# Altium schematic symbol library BARKO_SCHLIB.SchLib: 1064 symbols (part 2 of 11) (continued)
## CON-8POS-2.5MM-VERT (continued)
CONN HEADER 8POS 2.5MM VERT TIN; Manufacturer: Molex Waldom; Gender: Male; Number of Contacts: 8; Insulation Resistance: 1GR; Current Rating: 3A; Voltage Rating (DC): 250V; Glow Wire Compliant: Non-compliant; .PCBCHK: USED; .Creator: F:TALI; Washability: OK; Supplier 1: Digi-Key; Manufacturer Part Number: 22-03-5085; Stock 1: 10422; Pricing 1: 1=1.19, 10=1.046, 100=0.902, 500=0.738, 1000=0.656, 5000=0.574, 10000=0.5453 (USD); Number of Pins: 8; Contact Plating: Tin; Contact Material: Brass; Housing Material: Nylon; Orientation: Vertical; Packaging: Bag; Number of Rows: 1; Number of Positions: 8; Number of Circuits: 8; Length: 22.4mm; Height: 5.9mm; Width: 4.9mm; Lead Free: Lead Free; Flammability Rating: UL94 V-0; ComponentLink1URL: http://www.onlinecomponents.com/productFiles/mf-MOL/0022035085_pcb_headers.pdf; ComponentLink1Description: http://www.onlinecomponents.com/productFiles/mf-MOL/0022035085_pcb_headers.pdf; Supplier Part Number 1: WM18892-ND; .SCHCHK: USED
pins: 1 GND_IN, 2, 3, 4, 5, 6, 7, 8

## CON-8POS-2.54MM-SMD
designator J?, comment 2.54MM
TERM BLK 8P SIDE ENT 2.54MM SMD; Manufacturer: HARTING Technology; Manufacturer Part Number: 14010813102000; Gender: Receptacle; Voltage Rating: 160V; Number of Levels: 1; Number of Positions Per Level: 8; Current: 6A; Current Rating: 8.4A; Pitch: 0.1inch; Wire Gauge (Max): 26AWG; Wire Gauge (Min): 20AWG; Supplier 1: Digi-Key; Supplier Part Number 1: 1195-3662-1-ND; Stock: 484; Pricing: 1=2.11, 10=1.913, 100=1.6401 (USD); RoHS: Yes; Mount: Surface Mount,Panel; Contact Plating: Tin; Contact Material: Copper; Color: Black; Material: Polymer,Glass fibre; Housing Material: Liquid Crystal Polymer; Min Operating Temperature: -40°C; Max Operating Temperature: 125°C; Packaging: Tape and Reel; Voltage: 160V; Termination: Screwless; Number of Contacts: 8; Number of Rows: 2; Orientation: Horizontal; Length: 25.01mm; Width: 9.2mm; Depth: 5mm; REACH SVHC: No SVHC; ComponentLink1URL: https://datasheet.ciiva.com/48506/harting-1401xx13102000-eng-tds01-48506086.pdf?src-supplier=Distrelec; ComponentLink1Description: https://datasheet.ciiva.com/48506/harting-1401xx13102000-eng-tds01-48506086.pdf?src-supplier=Distrelec; ComponentLink2URL: https://datasheet.ciiva.com/46428/1817031-46428390.pdf?src-supplier=Element14; ComponentLink2Description: https://datasheet.ciiva.com/46428/1817031-46428390.pdf?src-supplier=Element14; ComponentLink3URL: https://datasheet.ciiva.com/49025/70357504-49025163.pdf?src-supplier=Allied+Electronics; ComponentLink3Description: https://datasheet.ciiva.com/49025/70357504-49025163.pdf?src-supplier=Allied+Electronics
footprint CON-HARTING-8POS-2.54MM
pins: 1 GND_IN, 2, 3, 4, 5, 6, 7, 8, MP1, MP2

## CON-8POS-691402910008B
designator J?, comment 2.54MM
2.54 MM TERMINAL BLOCK, HORIZONT; Manufacturer: Wurth Electronics; Manufacturer Part Number: 691402910008B; Supplier 1: Digi-Key; Supplier Part Number 1: 732-691402910008B-ND; Stock: 178; Pricing: 1=3.88, 10=3.623, 50=3.465, 100=3.256, 420=2.838 (USD); RoHS: No
footprint CON-8POS-691402910008B (2.54 mm - Screwless Horizontal Entry - 08p)
pins: 1, 2, 3, 4, 5, 6, 7, 8

## CON-10POS 2MM
designator J?, comment 2MM
CONN HEADER SMD 10POS 2MM; Manufacturer: METZ CONNECT; Manufacturer Part Number: PM20C05VBDN; .Creator: M.OZKAN; .PCBCHK: USED; ComponentLink1URL: http://portal.fciconnect.com/Comergent/fci/drawing/20021121.pdf?src-supplier=Avnet; ComponentLink1Description: http://portal.fciconnect.com/Comergent/fci/drawing/20021121.pdf?src-supplier=Avnet; ComponentLink2URL: http://portal.fciconnect.com/Comergent//fci/drawing/20021121.pdf?src-supplier=Digi-Key; ComponentLink2Description: http://portal.fciconnect.com/Comergent//fci/drawing/20021121.pdf?src-supplier=Digi-Key; ComponentLink3URL: https://datasheet.ciiva.com/720/57202-720124.pdf?src-supplier=Digi-Key; ComponentLink3Description: https://datasheet.ciiva.com/720/57202-720124.pdf?src-supplier=Digi-Key; ComponentLink4URL: https://datasheet.ciiva.com/9473/57202-9473821.pdf?src-supplier=Avnet; ComponentLink4Description: https://datasheet.ciiva.com/9473/57202-9473821.pdf?src-supplier=Avnet; ComponentLink5URL: https://datasheet.ciiva.com/8050/57202-8050203.pdf?src-supplier=Element14; ComponentLink5Description: https://datasheet.ciiva.com/8050/57202-8050203.pdf?src-supplier=Element14; ComponentLink6URL: https://datasheet.ciiva.com/5155/57202-5155726.pdf?src-supplier=Mouser; ComponentLink6Description: https://datasheet.ciiva.com/5155/57202-5155726.pdf?src-supplier=Mouser; .SCHCHK: USED; Supplier 1: Digi-Key; Supplier Part Number 1: 1849-1015-ND; Stock: 5119; Pricing: 1=0.61, 10=0.568, 100=0.4351, 500=0.3784, 1000=0.3122, 5000=0.2743, 10000=0.2554 (USD); RoHS: No
footprint CON-10POS 2MM SMD
pins: 1 (in), 2 (in), 3 (in), 4 (in), 5 (in), 6 (in), 7 (in), 8 (in), 9 (in), 10 (in)

## CON-10POS-2MM-14.50mm
designator J?, comment 2MM
CONN HEADER VERT 10POS 2MM; Manufacturer: Samtec; Manufacturer Part Number: MTMM-105-14-L-D-571; Supplier 1: Digi-Key; Supplier Part Number 1: MTMM-105-14-L-D-571-ND; Stock: 823; Pricing: 1=1.81, 10=1.642, 100=1.407, 500=1.1725, 1000=1.005, 5000=0.8911, 10000=0.871 (USD); RoHS: No; Contact Material: Bronze; Number of Rows: 2; Lead Free: Lead Free; ComponentLink1Description: datasheet; ComponentLink1URL: http://suddendocs.samtec.com/prints/mtmm-1xx-xx-xx-x-xxx-xx-xxx-mkt.pdf
footprint CON-10POS-2mm-14.5mm
pins: 1, 2, 3, 4, 5, 6, 7, 8, 9, 10

## CON-10POS-2MM-SMD
designator J?, comment 2MM
CONN RCPT 10POS 0.079 GOLD SMD; Manufacturer: TE Connectivity AMP; Manufacturer Part Number: 1-2314844-0; Supplier 1: Digi-Key; Supplier Part Number 1: 17-1-2314844-0-ND; Stock: 1348; Pricing: 1=0.78, 10=0.681 (USD); RoHS: No; ComponentLink1Description: datasheet; ComponentLink1URL: https://www.te.com/usa-en/product-1-2314844-0.datasheet.pdf
footprint CON-10POS 2MM RCPT
pins: 1, 2, 3, 4, 5, 6, 7, 8, 9, 10

## CON-12POS-1.27MM
designator J?, comment 1.27MM - MALE
CONN HEADER SMD 12POS 1.27MM; Manufacturer: Samtec; Manufacturer Part Number: FTSH-106-01-F-DV-P-TR; Number of Contacts: 12; Washability: OK; .Creator: M.OZKAN; .PCBCHK: USED; Supplier 1: Digi-Key; Stock 1: 614; Pricing 1: 1=2.67000, 10=2.42600, 100=2.07900 (USD); RoHS: Yes; Contact Plating: Gold; Contact Material: Bronze; Housing Color: Black; Housing Material: Polymer; Min Operating Temperature: -55°C; Max Operating Temperature: 125°C; Number of Rows: 2; Termination: Solder; Packaging: Tape and Reel; Gender: Male; Orientation: Straight; Length: 7.62mm; Pitch: 1.27mm; Depth: 3.43mm; Radiation Hardening: No; Lead Free: Lead Free; ComponentLink1URL: https://datasheet.ciiva.com/16689/ftsh-mt-16689389.pdf?src-supplier=Avnet+Europe; ComponentLink1Description: https://datasheet.ciiva.com/16689/ftsh-mt-16689389.pdf?src-supplier=Avnet+Europe; Supplier Part Number 1: SAM13943CT-ND; .SCHCHK: USED
footprint CON-2X6-1.27MM (CONN HEADER SMD 12POS 1.27MM)
pins: 1, 2, 3, 4, 5, 6, 7, 8, 9, 10, 11, 12

## CON-12POS-1.27MM-FEMALE-SMD
designator J?, comment 1.27MM
CONN RCPT 12POS 0.05 GOLD SMD; Manufacturer 1: Samtec; Manufacturer Part Number 1: FLE-106-01-G-DV-K-TR; Contact Resistance: 15mR; Gender: Receptacle; Number of Contacts: 12; Washability: OK; .Creator: M.OZKAN; .PCBCHK: USED; Supplier 1: Digi-Key; Stock 1: 737; Pricing 1: 1=2,55000, 10=2,45000 (USD); RoHS: Yes; Contact Plating: Gold; Contact Material: Bronze; Housing Color: Black; Housing Material: Polymer; Min Operating Temperature: -55°C; Max Operating Temperature: 125°C; Number of Rows: 2; Packaging: Tape and Reel; Termination: Solder; Orientation: Straight; Length: 7.73mm; Pitch: 1.27mm; Depth: 3.33mm; Radiation Hardening: No; REACH SVHC: No SVHC; ComponentLink1URL: http://components.arrow.com/part/dataview/0323_01323830?src-supplier=Arrow+Europe; ComponentLink1Description: http://components.arrow.com/part/dataview/0323_01323830?src-supplier=Arrow+Europe; ComponentLink2URL: http://www.farnell.com/datasheets/1927685.pdf?src-supplier=Farnell; ComponentLink2Description: http://www.farnell.com/datasheets/1927685.pdf?src-supplier=Farnell; ComponentLink3URL: http://www.samtec.com/documents/webfiles/pdf/FLE_SM.PDF?src-supplier=Avnet; ComponentLink3Description: http://www.samtec.com/documents/webfiles/pdf/FLE_SM.PDF?src-supplier=Avnet; Supplier Part Number 1: SAM13855CT-ND; .SCHCHK: USED
footprint CON-12POS FEMALE 2MM SMD
pins: 1, 2, 3, 4, 5, 6, 7, 8, 9, 10, 11, 12

## CON-12POS-1.27MM-MALE-SMD
designator J?, comment 1.27MM
CONN HEADER SMD 12POS 1.27MM; Manufacturer 1: Samtec; Manufacturer Part Number 1: FTSH-106-02-L-DV-P-TR; Number of Contacts: 12; Gender: Male; Washability: OK; .Creator: M.OZKAN; .PCBCHK: USED; Supplier 1: Avnet; Stock 1: 0; Pricing 1: 125=2,19000, 250=1,99000, 500=1,89000, 750=1,79000, 1250=1,69000 (USD); RoHS: Yes; Mount: Surface Mount; Contact Plating: Gold; Contact Material: Bronze; Number of Rows: 2; Packaging: Tape and Reel; Termination: SMD/SMT; Pitch: 1.27mm; Radiation Hardening: No; REACH SVHC: No SVHC; Lead Free: Lead Free; ComponentLink1URL: https://datasheet.ciiva.com/10306/ftsh-mt-10306247.pdf?src-supplier=Avnet; ComponentLink1Description: https://datasheet.ciiva.com/10306/ftsh-mt-10306247.pdf?src-supplier=Avnet; ComponentLink2URL: https://datasheet.ciiva.com/41677/1801432-41677018.pdf?src-supplier=Newark; ComponentLink2Description: https://datasheet.ciiva.com/41677/1801432-41677018.pdf?src-supplier=Newark; Supplier Part Number 1: FTSH-106-02-L-DV-P-TR; .SCHCHK: USED
footprint CON-12POS MALE 2MM SMD
pins: 1, 2, 3, 4, 5, 6, 7, 8, 9, 10, 11, 12

## CON-12POS-1.27MM-RCP
designator J?, comment 1.27MM-FEMALE
CONN RCPT 12POS 0.05 GOLD SMD; Manufacturer: Samtec; Manufacturer Part Number: FLE-106-01-G-DV-K-TR; Contact Resistance: 15mR; Gender: Receptacle; Number of Contacts: 12; Pitch: 1.27mm; Washability: OK; .Creator: M.OZKAN; .PCBCHK: USED; Supplier 1: Digi-Key; Stock 1: 737; Pricing 1: 1=2.55000, 10=2.45000 (USD); RoHS: Yes; Contact Plating: Gold; Contact Material: Bronze; Housing Color: Black; Housing Material: Polymer; Min Operating Temperature: -55°C; Max Operating Temperature: 125°C; Number of Rows: 2; Packaging: Tape and Reel; Termination: Solder; Orientation: Straight; Length: 7.73mm; Depth: 3.33mm; Radiation Hardening: No; REACH SVHC: No SVHC; ComponentLink1URL: http://components.arrow.com/part/dataview/0323_01323830?src-supplier=Arrow+Europe; ComponentLink1Description: http://components.arrow.com/part/dataview/0323_01323830?src-supplier=Arrow+Europe; ComponentLink2URL: http://www.farnell.com/datasheets/1927685.pdf?src-supplier=Farnell; ComponentLink2Description: http://www.farnell.com/datasheets/1927685.pdf?src-supplier=Farnell; ComponentLink3URL: http://www.samtec.com/documents/webfiles/pdf/FLE_SM.PDF?src-supplier=Avnet; ComponentLink3Description: http://www.samtec.com/documents/webfiles/pdf/FLE_SM.PDF?src-supplier=Avnet; Supplier Part Number 1: SAM13855CT-ND; .SCHCHK: USED
footprint CON-2X6-1.27MM-RCPT (CONN RCPT 12POS 0.05 GOLD SMD)
pins: 1, 2, 3, 4, 5, 6, 7, 8, 9, 10, 11, 12

## CON-12POS-1MM
designator J?, comment 1MM  Mating: 5013301200
CONN HEADER SMD 12POS 1MM; Manufacturer: Molex; Manufacturer Part Number: 501331-1207; Current Rating: 1A; Voltage Rating: 50V; Number of Positions: 12; Gender: Male; Connector Type: Male Pin; Contact Resistance: 20mR; Glow Wire Compliant: Non-compliant; Washability: OK; .Creator: M.OZKAN; .PCBCHK: USED; Supplier 1: Digi-Key; Supplier Part Number 1: WM7889CT-ND; Stock 1: 5532; Pricing 1: 1=0.96000, 10=0.84500, 100=0.72870, 500=0.59618 (USD); RoHS: Yes; Mount: Surface Mount; Contact Material: Bronze,Tin; Color: Natural; Housing Color: Natural; Housing Material: Nylon; Contact Plating: Tin; Min Operating Temperature: -40°C; Max Operating Temperature: 85°C; Number of Rows: 1; Package Quantity: 1100; Packaging: Tape and Reel; Termination: Solder; Fastening Type: Detent; Number of Contacts: 12; Orientation: Vertical; Max Voltage Rating (DC): 50V; Max Voltage Rating (AC): 50V; Voltage Rating (DC): 50V; Number of Circuits: 12; Length: 14.24mm; Pitch: 1mm; Depth: 5.07mm; Radiation Hardening: No; REACH SVHC: Unknown; Lead Free: Lead Free; ComponentLink1URL: https://datasheet.ciiva.com/724/5013311107-sd-724400.pdf?src-supplier=Digi-Key; ComponentLink1Description: https://datasheet.ciiva.com/724/5013311107-sd-724400.pdf?src-supplier=Digi-Key; ComponentLink2URL: https://datasheet.ciiva.com/23725/650551-23725122.pdf?src-supplier=Newark; ComponentLink2Description: https://datasheet.ciiva.com/23725/650551-23725122.pdf?src-supplier=Newark; ComponentLink3URL: https://datasheet.ciiva.com/5153/5013311207-pcb-headers-179229-5153793.pdf?src-supplier=Mouser; ComponentLink3Description: https://datasheet.ciiva.com/5153/5013311207-pcb-headers-179229-5153793.pdf?src-supplier=Mouser; ComponentLink4URL: https://datasheet.ciiva.com/9469/5013311207-pcb-headers-9469090.pdf?src-supplier=Avnet; ComponentLink4Description: https://datasheet.ciiva.com/9469/5013311207-pcb-headers-9469090.pdf?src-supplier=Avnet; ComponentLink5URL: https://datasheet.ciiva.com/25289/1631882-25289928.pdf?src-supplier=Newark; ComponentLink5Description: https://datasheet.ciiva.com/25289/1631882-25289928.pdf?src-supplier=Newark; ComponentLink6URL: https://datasheet.ciiva.com/11747/0900766b80b0af91-11747886.pdf?src-supplier=RSComponents; ComponentLink6Description: https://datasheet.ciiva.com/11747/0900766b80b0af91-11747886.pdf?src-supplier=RSComponents; ComponentLink7URL: https://datasheet.ciiva.com/26288/35765013311207-pcb-headers-26288702.pdf?src-supplier=Onlinecomponents.com; ComponentLink7Description: https://datasheet.ciiva.com/26288/35765013311207-pcb-headers-26288702.pdf?src-supplier=Onlinecomponents.com; ComponentLink8URL: https://datasheet.ciiva.com/16690/5013311207-pcb-headers-16690567.pdf?src-supplier=Avnet+Europe; ComponentLink8Description: https://datasheet.ciiva.com/16690/5013311207-pcb-headers-16690567.pdf?src-supplier=Avnet+Europe; ComponentLink9URL: https://datasheet.ciiva.com/14156/501331-2-eng-tds-14156277.pdf?src-supplier=Distrelec; ComponentLink9Description: https://datasheet.ciiva.com/14156/501331-2-eng-tds-14156277.pdf?src-supplier=Distrelec; ComponentLink10URL: https://datasheet.ciiva.com/9469/5013311207-pcb-headers-9469096.pdf?src-supplier=Avnet; ComponentLink10Description: https://datasheet.ciiva.com/9469/5013311207-pcb-headers-9469096.pdf?src-supplier=Avnet; .SCHCHK: USED
footprint CON-12POS-1MM-SMD
pins: 1, 2, 3, 4, 5, 6, 7, 8, 9, 10, 11, 12, MP1, MP2

## CON-12POS-2.54MM RCPT
designator J?, comment 2.54MM
CONN RCPT 12POS 0.1 GOLD SMD; Manufacturer: Amphenol FCI; Manufacturer Part Number: 89898-306ALF; Voltage Rating: 1kV; Current Rating: 3A; Contact Resistance: 20mR; Connector Type: Receptacle; Number of Positions: 12; Row Spacing: 0.1inch; Supplier 1: Digi-Key; Supplier Part Number 1: 609-5156-1-ND; Stock: 6320; Pricing: 1=1.41, 10=1.243, 100=1.0728 (USD); RoHS: Yes; Mount: Surface Mount; Housing Color: Grey; Contact Plating: Gold; Color: Grey; Contact Material: Bronze; Housing Material: Thermoplastic; Min Operating Temperature: -65°C; Max Operating Temperature: 125°C; Orientation: Straight; Packaging: Tape and Reel; Number of Rows: 2; Package Quantity: 650; Termination: Solder; Number of Contacts: 12; Max Voltage Rating (AC): 1kV; Gender: Receptacle; Length: 15.16mm; Pitch: 2.54mm; Depth: 5.08mm; Radiation Hardening: No; Lead Free: Lead Free; REACH SVHC: No SVHC; ComponentLink1URL: https://datasheet.ciiva.com/9473/89898-9473111.pdf?src-supplier=Avnet; ComponentLink1Description: https://datasheet.ciiva.com/9473/89898-9473111.pdf?src-supplier=Avnet; ComponentLink2URL: https://datasheet.ciiva.com/412/89898-412170.pdf?src-supplier=Digi-Key; ComponentLink2Description: https://datasheet.ciiva.com/412/89898-412170.pdf?src-supplier=Digi-Key; ComponentLink3URL: https://datasheet.ciiva.com/16731/89898-16731623.pdf?src-supplier=Avnet+Europe; ComponentLink3Description: https://datasheet.ciiva.com/16731/89898-16731623.pdf?src-supplier=Avnet+Europe; ComponentLink4URL: https://datasheet.ciiva.com/46428/320508-46428539.pdf?src-supplier=Element14; ComponentLink4Description: https://datasheet.ciiva.com/46428/320508-46428539.pdf?src-supplier=Element14
footprint CON-12POS 2.54MM RCPT
pins: 1, 2, 3, 4, 5, 6, 7, 8, 9, 10, 11, 12

## CON-12POS-2.54MM-HEADER SMD
designator J?, comment 2.54MM
CONN HEADER SMD 12POS 2.54MM; Manufacturer: Amphenol FCI; Manufacturer Part Number: 95278-101-12LF; Connector Type: Male Pin; Gender: Male; Number of Positions: 12; Insulation Resistance: 5GR; Max Voltage Rating (AC): 1.5kV; Current Rating: 3A; Row Spacing: 0.1inch; Supplier 1: Digi-Key; Supplier Part Number 1: 609-5754-ND; Stock: 624; Pricing: 1=0.73, 10=0.641, 100=0.5529, 500=0.4523, 1000=0.4021, 5000=0.3518, 10000=0.3342 (USD); RoHS: Yes; Mount: Surface Mount; Housing Color: Black; Housing Material: Thermoplastic; Contact Material: Bronze; Contact Plating: Gold,GXT; Color: Black; Min Operating Temperature: -65°C; Max Operating Temperature: 125°C; Orientation: Straight; Termination: Solder; Number of Contacts: 12; Number of Rows: 2; Voltage Rating: 1.5kV; Packaging: Bulk; Contact Gender: Male; Package Quantity: 500; Length: 15.24mm; Pitch: 2.54mm; Contact Mating Length: 0.232inch; Depth: 4.83mm; Flammability Rating: UL94 V-0; Lead Free: Lead Free; ComponentLink1URL: https://datasheet.ciiva.com/11748/0900766b80d782a4-11748784.pdf?src-supplier=RSComponents; ComponentLink1Description: https://datasheet.ciiva.com/11748/0900766b80d782a4-11748784.pdf?src-supplier=RSComponents; ComponentLink2URL: https://datasheet.ciiva.com/16731/95278-16731685.pdf?src-supplier=Avnet+Europe; ComponentLink2Description: https://datasheet.ciiva.com/16731/95278-16731685.pdf?src-supplier=Avnet+Europe; ComponentLink3URL: https://datasheet.ciiva.com/10139/95278-10139126.pdf?src-supplier=Avnet; ComponentLink3Description: https://datasheet.ciiva.com/10139/95278-10139126.pdf?src-supplier=Avnet; ComponentLink4URL: https://datasheet.ciiva.com/724/95278-724604.pdf?src-supplier=Digi-Key; ComponentLink4Description: https://datasheet.ciiva.com/724/95278-724604.pdf?src-supplier=Digi-Key
footprint CON-12POS 2.54MM HEADER
pins: 1, 2, 3, 4, 5, 6, 7, 8, 9, 10, 11, 12

## CON-12POS-2MM-HEADER-14mm
designator J?, comment 2MM
CONN HEADER VERT 12POS 2MM; Manufacturer: Samtec; Manufacturer Part Number: MTMM-106-14-T-D-570; Gender: Male; Number of Contacts: 12; Supplier 1: Digi-Key; Supplier Part Number 1: MTMM-106-14-T-D-570-ND; Stock: 673; Pricing: 1=1.42, 10=1.25, 100=1.078, 500=0.882, 1000=0.784, 5000=0.686, 10000=0.6517 (USD); RoHS: Yes; Mount: Through Hole; Contact Material: Bronze; Contact Plating: Tin; Termination: Solder; Number of Rows: 2; Packaging: Bulk; Pitch: 2mm; Lead Free: Lead Free; ComponentLink1URL: http://www.samtec.com/documents/webfiles/pdf/MTMM_TH.PDF?src-supplier=Avnet; ComponentLink1Description: http://www.samtec.com/documents/webfiles/pdf/MTMM_TH.PDF?src-supplier=Avnet
footprint CON-12POS MALE 2MM SMD 14mm
pins: 1, 2, 3, 4, 5, 6, 7, 8, 9, 10, 11, 12

## CON-12POS-2MM-HEADER-SMD
designator J?, comment 2MM
CONN HEADER 12POS 2MM STR DL SMD; Manufacturer: Amphenol FCI; Manufacturer Part Number: 57202-G52-06LF; Gender: Male; Connector Type: Male Pin; Number of Positions: 12; Max Voltage Rating (AC): 650V; Contact Resistance: 25mR; Current Rating: 2A; Insulation Resistance: 1GR; Row Spacing: 0.079inch; Supplier 1: Digi-Key; Supplier Part Number 1: 609-2618-ND; Stock: 777; Pricing: 1=1.77, 10=1.603, 100=1.3736, 500=1.1447, 1000=0.9812, 5000=0.87, 10000=0.8503 (USD); RoHS: Yes; Mount: Surface Mount; Housing Color: Black; Contact Plating: Gold,GXT; Contact Material: Bronze,Copper Alloy; Color: Black; Housing Material: Thermoplastic; Min Operating Temperature: -55°C; Max Operating Temperature: 125°C; Orientation: Straight; Packaging: Bulk; Number of Rows: 2; Package Quantity: 200; Termination: Solder; Number of Contacts: 12; Voltage Rating: 650V; Length: 12mm; Width: 4mm; Pitch: 2mm; Depth: 4mm; Contact Mating Length: 0.157inch; Radiation Hardening: No; Lead Free: Lead Free; REACH SVHC: No SVHC; Flammability Rating: UL94 V-0; ComponentLink1URL: https://datasheet.ciiva.com/9473/57202-9473840.pdf?src-supplier=Avnet; ComponentLink1Description: https://datasheet.ciiva.com/9473/57202-9473840.pdf?src-supplier=Avnet; ComponentLink2URL: https://datasheet.ciiva.com/11748/0900766b80d77b62-11748235.pdf?src-supplier=RSComponents; ComponentLink2Description: https://datasheet.ciiva.com/11748/0900766b80d77b62-11748235.pdf?src-supplier=RSComponents; ComponentLink3URL: https://datasheet.ciiva.com/8050/51822-8050215.pdf?src-supplier=Element14; ComponentLink3Description: https://datasheet.ciiva.com/8050/51822-8050215.pdf?src-supplier=Element14; ComponentLink4URL: https://datasheet.ciiva.com/711/57202-711208.pdf?src-supplier=Digi-Key; ComponentLink4Description: https://datasheet.ciiva.com/711/57202-711208.pdf?src-supplier=Digi-Key; ComponentLink5URL: https://datasheet.ciiva.com/1443/51822-1443273.pdf?src-supplier=Farnell; ComponentLink5Description: https://datasheet.ciiva.com/1443/51822-1443273.pdf?src-supplier=Farnell
footprint CON-12POS MALE 2MM SMD
pins: 1, 2, 3, 4, 5, 6, 7, 8, 9, 10, 11, 12

## CON-12POS-2MM-RCPT-14MM
designator J?, comment 2MM
CONN RCPT 12POS 0.079 GOLD SMD; Manufacturer: TE Connectivity AMP; Manufacturer Part Number: 1-2314844-2; Supplier 1: Digi-Key; Supplier Part Number 1: 17-1-2314844-2-ND; Stock: 1055; Pricing: 1=0.92, 10=0.796 (USD); RoHS: No; ComponentLink1Description: datasheet; ComponentLink1URL: https://www.te.com/commerce/DocumentDelivery/DDEController?Action=showdoc&DocId=Customer+Drawing%7F2307816%7FA2%7Fpdf%7FEnglish%7FENG_CD_2307816_A2.pdf%7F1-2314844-2
footprint CON-12POS FEMALE 2MM SMD 14mm
pins: 1, 2, 3, 4, 5, 6, 7, 8, 9, 10, 11, 12

## CON-12POS-2MM-RCPT-SMD
designator J?, comment 2MM
CONN RCPT 12POS 0.079 GOLD SMD; Manufacturer: Amphenol FCI; Manufacturer Part Number: 55510-112TRLF; Contact Resistance: 20mR; Max Voltage Rating (DC): 200.2kV; Current Rating: 1A; Voltage Rating (AC): 200V; Number of Positions: 12; Connector Type: Receptacle,Socket; Gender: Receptacle; Insulation Resistance: 1GR; Row Spacing: 0.079inch; Supplier 1: Digi-Key; Supplier Part Number 1: 609-6199-1-ND; Stock: 3000; Pricing: 1=2.27, 10=2.056, 100=1.7621 (USD); RoHS: Yes; Mount: Surface Mount; Contact Plating: Gold; Housing Material: Plastic; Contact Material: Bronze; Color: Black; Material: Thermoplastic; Housing Color: Black; Min Operating Temperature: -55°C; Max Operating Temperature: 125°C; Number of Rows: 2; Packaging: Tape and Reel; Package Quantity: 750; Voltage Rating: 200V; Termination: Solder; Max Voltage Rating (AC): 200V; Number of Contacts: 12; Orientation: Straight; Length: 11.92mm; Lead Pitch: 2mm; Pitch: 2mm; Depth: 4mm; Width: 4mm; Flammability Rating: UL94 V-0; Lead Free: Lead Free; REACH SVHC: No SVHC; ComponentLink1URL: https://datasheet.ciiva.com/13871/55510-222941-13871349.pdf?src-supplier=Mouser; ComponentLink1Description: https://datasheet.ciiva.com/13871/55510-222941-13871349.pdf?src-supplier=Mouser; ComponentLink2URL: https://datasheet.ciiva.com/11746/0900766b80d77b63-11746681.pdf?src-supplier=RSComponents; ComponentLink2Description: https://datasheet.ciiva.com/11746/0900766b80d77b63-11746681.pdf?src-supplier=RSComponents; ComponentLink3URL: https://datasheet.ciiva.com/751/55510-751917.pdf?src-supplier=Digi-Key; ComponentLink3Description: https://datasheet.ciiva.com/751/55510-751917.pdf?src-supplier=Digi-Key; ComponentLink4URL: https://datasheet.ciiva.com/10141/55510-10141119.pdf?src-supplier=Avnet; ComponentLink4Description: https://datasheet.ciiva.com/10141/55510-10141119.pdf?src-supplier=Avnet; ComponentLink5URL: https://datasheet.ciiva.com/8050/320800-8050119.pdf?src-supplier=Element14; ComponentLink5Description: https://datasheet.ciiva.com/8050/320800-8050119.pdf?src-supplier=Element14; ComponentLink6URL: https://datasheet.ciiva.com/16688/55510-16688647.pdf?src-supplier=Avnet+Europe; ComponentLink6Description: https://datasheet.ciiva.com/16688/55510-16688647.pdf?src-supplier=Avnet+Europe
footprint CON-12POS FEMALE 2MM SMD
pins: 1, 2, 3, 4, 5, 6, 7, 8, 9, 10, 11, 12

## CON-14POS-PAD
designator J?, comment PAD
Washability: OK; .Creator: M.OZKAN; .PCBCHK: USED; .SCHCHK: USED
footprint 14 POS PAD
pins: 1, 2, 3, 4, 5, 6, 7, 8, 9, 10, 11, 12, 13, 14

## CON-16POS-2MM
designator J?, comment 16POS
.Creator: F:TALI; .PCBCHK: USED; Washability: OK; .SCHCHK: USED
footprint CON-16POS-2MM
pins: 1, 2, 3, 4, 5, 6, 7, 8, 9, 10, 11, 12, 13, 14, 15, 16, 17 27, 18

## CON-16POS-2MM-RA
designator CON?, comment 16POS  Lead Pitch: 2MM
CONN HEADER 16POS 2MM RT ANG TIN; Manufacturer: Hirose; Manufacturer Part Number: DF11-16DP-2DS(24); Number of Contacts: 16; Gender: Male; Connector Type: Male Pin; Current Rating: 2A; Contact Resistance: 30mR; Mating Cycles: 30; Voltage Rating (AC): 30V; Voltage Rating: 250V; Insulation Resistance: 1GR; Row Spacing: 0.079inch; .Creator: F:TALI; .PCBCHK: USED; Washability: OK; Supplier 1: Digi-Key; Stock 1: 5210; Pricing 1: 1=0.96, 27=0.79222, 108=0.7263, 513=0.59427, 1026=0.52824 (USD); Mount: Through Hole; Contact Plating: Tin; Contact Material: Brass,Copper Alloy,Tin; Color: Black; Housing Color: Black; Housing Material: Polyamide; Min Operating Temperature: -30°C; Max Operating Temperature: 85°C; Number of Rows: 2; Termination: Solder; Package Quantity: 27; Fastening Type: Detent; Packaging: Rail/Tube; Number of Positions: 16; Max Current Rating: 2A; Orientation: Right Angle; Length: 18mm; Height: 5mm; Pitch: 2mm; Contact Mating Length: 0.118inch; Depth: 10mm; Radiation Hardening: No; Lead Free: Lead Free; REACH SVHC: No SVHC; Flammability Rating: UL94 V-0; ComponentLink1URL: https://www.verical.com/server-webapp/html/getDatasheet?partID=440614; ComponentLink1Description: https://www.verical.com/server-webapp/html/getDatasheet?partID=440614; ComponentLink2URL: http://www.farnell.com/datasheets/91550.pdf; ComponentLink2Description: http://www.farnell.com/datasheets/91550.pdf; ComponentLink3URL: https://www.distrelec.biz/Web/Downloads/_t/ds/DF11serie_eng_tds.pdf?mime=application%2Fpdf; ComponentLink3Description: https://www.distrelec.biz/Web/Downloads/_t/ds/DF11serie_eng_tds.pdf?mime=application%2Fpdf; ComponentLink4URL: http://www.mouser.com/ds/2/185/DF11_catalog-1064296.pdf; ComponentLink4Description: http://www.mouser.com/ds/2/185/DF11_catalog-1064296.pdf; Supplier Part Number 1: H10250-ND; .SCHCHK: USED
footprint CON-16POS-2MM-RA
pins: 1, 2, 3, 4, 5, 6, 7, 8, 9, 10, 11, 12, 13, 14, 15, 16

## CON-16POS-2MM_SMD
designator J?, comment 16POS
.Creator: F:TALI; .PCBCHK: USED; Washability: OK; .SCHCHK: USED
footprint CON-2x8-2MM-90DEG
pins: 1, 2, 3, 4, 5, 6, 7, 8, 9, 10, 11, 12, 13, 14, 15, 16

## CON-20POS-2.54MM HEADER
designator J?, comment 2.54MM
CONN HEADER VERT 20POS 2.54MM; Manufacturer: On Shore Technology Inc.; Manufacturer Part Number: 302-S201; Voltage Rating: 1kV; Current Rating: 3A; Contact Resistance: 20mR; Connector Type: Receptacle; Number of Positions: 20; Row Spacing: 0.1inch; Stock: 6320; Pricing: 1=1.41, 10=1.243, 100=1.0728 (USD); RoHS: Yes; Mount: Surface Mount; Housing Color: Grey; Contact Plating: Gold; Color: Grey; Contact Material: Bronze; Housing Material: Thermoplastic; Min Operating Temperature: -65°C; Max Operating Temperature: 125°C; Orientation: Straight; Packaging: Tape and Reel; Number of Rows: 2; Package Quantity: 650; Termination: Solder; Number of Contacts: 20; Max Voltage Rating (AC): 1kV; Gender: Receptacle; Length: 15.16mm; Pitch: 2.54mm; Depth: 5.08mm; Radiation Hardening: No; Lead Free: Lead Free; REACH SVHC: No SVHC; ComponentLink1URL: https://datasheet.ciiva.com/9473/89898-9473111.pdf?src-supplier=Avnet; ComponentLink1Description: https://datasheet.ciiva.com/9473/89898-9473111.pdf?src-supplier=Avnet; ComponentLink2URL: https://datasheet.ciiva.com/412/89898-412170.pdf?src-supplier=Digi-Key; ComponentLink2Description: https://datasheet.ciiva.com/412/89898-412170.pdf?src-supplier=Digi-Key; ComponentLink3URL: https://datasheet.ciiva.com/16731/89898-16731623.pdf?src-supplier=Avnet+Europe; ComponentLink3Description: https://datasheet.ciiva.com/16731/89898-16731623.pdf?src-supplier=Avnet+Europe; ComponentLink4URL: https://datasheet.ciiva.com/46428/320508-46428539.pdf?src-supplier=Element14; ComponentLink4Description: https://datasheet.ciiva.com/46428/320508-46428539.pdf?src-supplier=Element14
footprint CON-SWD-20 POSITION
pins: 1, 2, 3, 4, 5, 6, 7, 8, 9, 10, 11, 12, 13, 14, 15, 16, 17, 18, 19, 20

## CON-26POS-2MM
designator J?, comment CONN HEADER VERT 26POS 2MM  (value not drawn)
Connector Header Through Hole 26 position 0.079" (2.00mm); Manufacturer 1: Harwin; Manufacturer Part Number 1: M225-5202646; Washability: OK; .Creator: M.OZKAN; .PCBCHK: USED; Supplier 1: Digi-Key; Stock 1: 183; Pricing 1: 1=2,57000, 10=2,46700, 100=2,05600, 500=1,74760, 1000=1,49060, 5000=1,33640 (USD); RoHS: No; Supplier Part Number 1: 952-4171-ND; .SCHCHK: USED
pins: 1 (io), 2 (io), 3 (io), 4 (io), 5 (io), 6 (io), 7 (io), 8 (io), 9 (io), 10 (io), 11 (io), 12 (io), 13 (io), 14 (io), 15 (io), 16 (io), 17 (io), 18 (io), 19 (io), 20 (io), 21 (io), 22 (io), 23 (io), 24 (io), 25 (io), 26 (io)

## CON-26POS-KPT2E16-26PEX
designator J?, comment KPT2E16-26PEX
KPT 26C 26#20 PIN RECP; Manufacturer: ITT Cannon; Manufacturer Part Number: KPT2E16-26PEXA206; Connector Type: Receptacle; Number of Positions: 26; Current Rating: 7.5A; Ratings: Environment Resistant; Washability: OK; .Creator: M.OZKAN; .PCBCHK: USED; Supplier 1: Digi-Key; Supplier Part Number 1: KPT2E16-26PEXA206-ND; Stock: 585; Pricing: 1=59.65, 10=50.12, 25=46.5788, 50=42.7652, 100=39.2242, 250=36.5003, 500=36.2279 (USD); RoHS: Yes; Mount: Through Hole,Panel,Flanges; Contact Plating: Gold; Min Operating Temperature: -55°C; Max Operating Temperature: 125°C; Termination: Solder; Package Quantity: 1; Fastening Type: Bayonet; Packaging: Bulk; ComponentLink1URL: https://www.ittcannon.com/Core/medialibrary/ITTCannon/website/Literature/Catalogs-Brochures/ITT-Cannon-KPT-KPSE-KPTC-Catalog.pdf?src-supplier=Digi-Key; ComponentLink1Description: https://www.ittcannon.com/Core/medialibrary/ITTCannon/website/Literature/Catalogs-Brochures/ITT-Cannon-KPT-KPSE-KPTC-Catalog.pdf?src-supplier=Digi-Key; .SCHCHK: USED
footprint CON-26POS-KPT2E16-26PEX
pins: A (io), a2 (io), B (io), b2 (io), C (io), c2 (io), D (io), E (io), F (io), G (io), H (io), J (io), K (io), L (io), M (io), N (io), P (io), R (io), S (io), T (io), U (io), V (io), W (io), X (io), Y (io), Z (io)

## CON-26POS-KPT2E1626SEX
designator J?, comment KPT2E16-26SEX
KPT 26C 26#20 SKT RECP; Manufacturer: ITT Cannon; Body Material: Aluminium; Body Plating: Cadmium; Plating: Cadmium,Chromate; Number of Positions: 26; Connector Type: Receptacle,Circular; Current Rating: 7.5A; Gender: Receptacle; Strain Relief: No (Without); Ratings: Environment Resistant; Washability: OK; .Creator: M.OZKAN; .PCBCHK: USED; Supplier 1: Digi-Key; Supplier Part Number 1: IKPT2E16-26SEX-ND; Manufacturer Part Number: KPT2E16-26SEX; Stock: 715; Pricing: 1=56.17, 10=47.486, 25=44.1668, 50=41.8692, 100=37.0185, 250=34.4655 (USD); RoHS: Yes; Mount: Through Hole,Panel,Flanges; Contact Plating: Gold; Contact Material: Copper Alloy,Copper; Min Operating Temperature: -55°C; Max Operating Temperature: 125°C; Termination: Solder; Fastening Type: Bayonet; Packaging: Bulk; Number of Contacts: 26; Max Current Rating: 7.5A; Orientation: Straight; Package Quantity: 1; Length: 30.1mm; Depth: 31.3mm; REACH SVHC: No SVHC; ComponentLink1URL: https://datasheet.ciiva.com/7688/1811874-7688950.pdf?src-supplier=Element14; ComponentLink1Description: https://datasheet.ciiva.com/7688/1811874-7688950.pdf?src-supplier=Element14; .SCHCHK: USED
footprint CON-26POS-KPT2E16-26SEX
pins: A (io), a2 (io), B (io), b2 (io), C (io), c2 (io), D (io), E (io), F (io), G (io), H (io), J (io), K (io), L (io), M (io), N (io), P (io), R (io), S (io), T (io), U (io), V (io), W (io), X (io), Y (io), Z (io)

## CON-36POS-2.54MM-HEADER
designator J?, comment 2.54MM
CONN HEADER VERT 36POS 2.54MM; Manufacturer: Samtec; Manufacturer Part Number: TSW-118-17-G-D-LL; Number of Contacts: 36; Gender: Male; Supplier 1: Digi-Key; Supplier Part Number 1: TSW-118-17-G-D-LL-ND; Stock: 164; Pricing: 1=4.43, 10=4.248, 25=3.894 (USD); RoHS: Yes; Mount: Through Hole; Contact Plating: Gold; Contact Material: Bronze; Termination: Through Hole; Number of Rows: 2; Pitch: 2.54mm; REACH SVHC: No SVHC; ComponentLink1URL: https://datasheet.ciiva.com/9817/htsw-th-9817775.pdf?src-supplier=Avnet; ComponentLink1Description: https://datasheet.ciiva.com/9817/htsw-th-9817775.pdf?src-supplier=Avnet
part A pins: 1, 3, 5, 7, 9, 11, 13, 15, 17, 19, 21, 23, 25, 27, 29, 31, 33, 35
part B pins: 2, 4, 6, 8, 10, 12, 14, 16, 18, 20, 22, 24, 26, 28, 30, 32, 34, 36

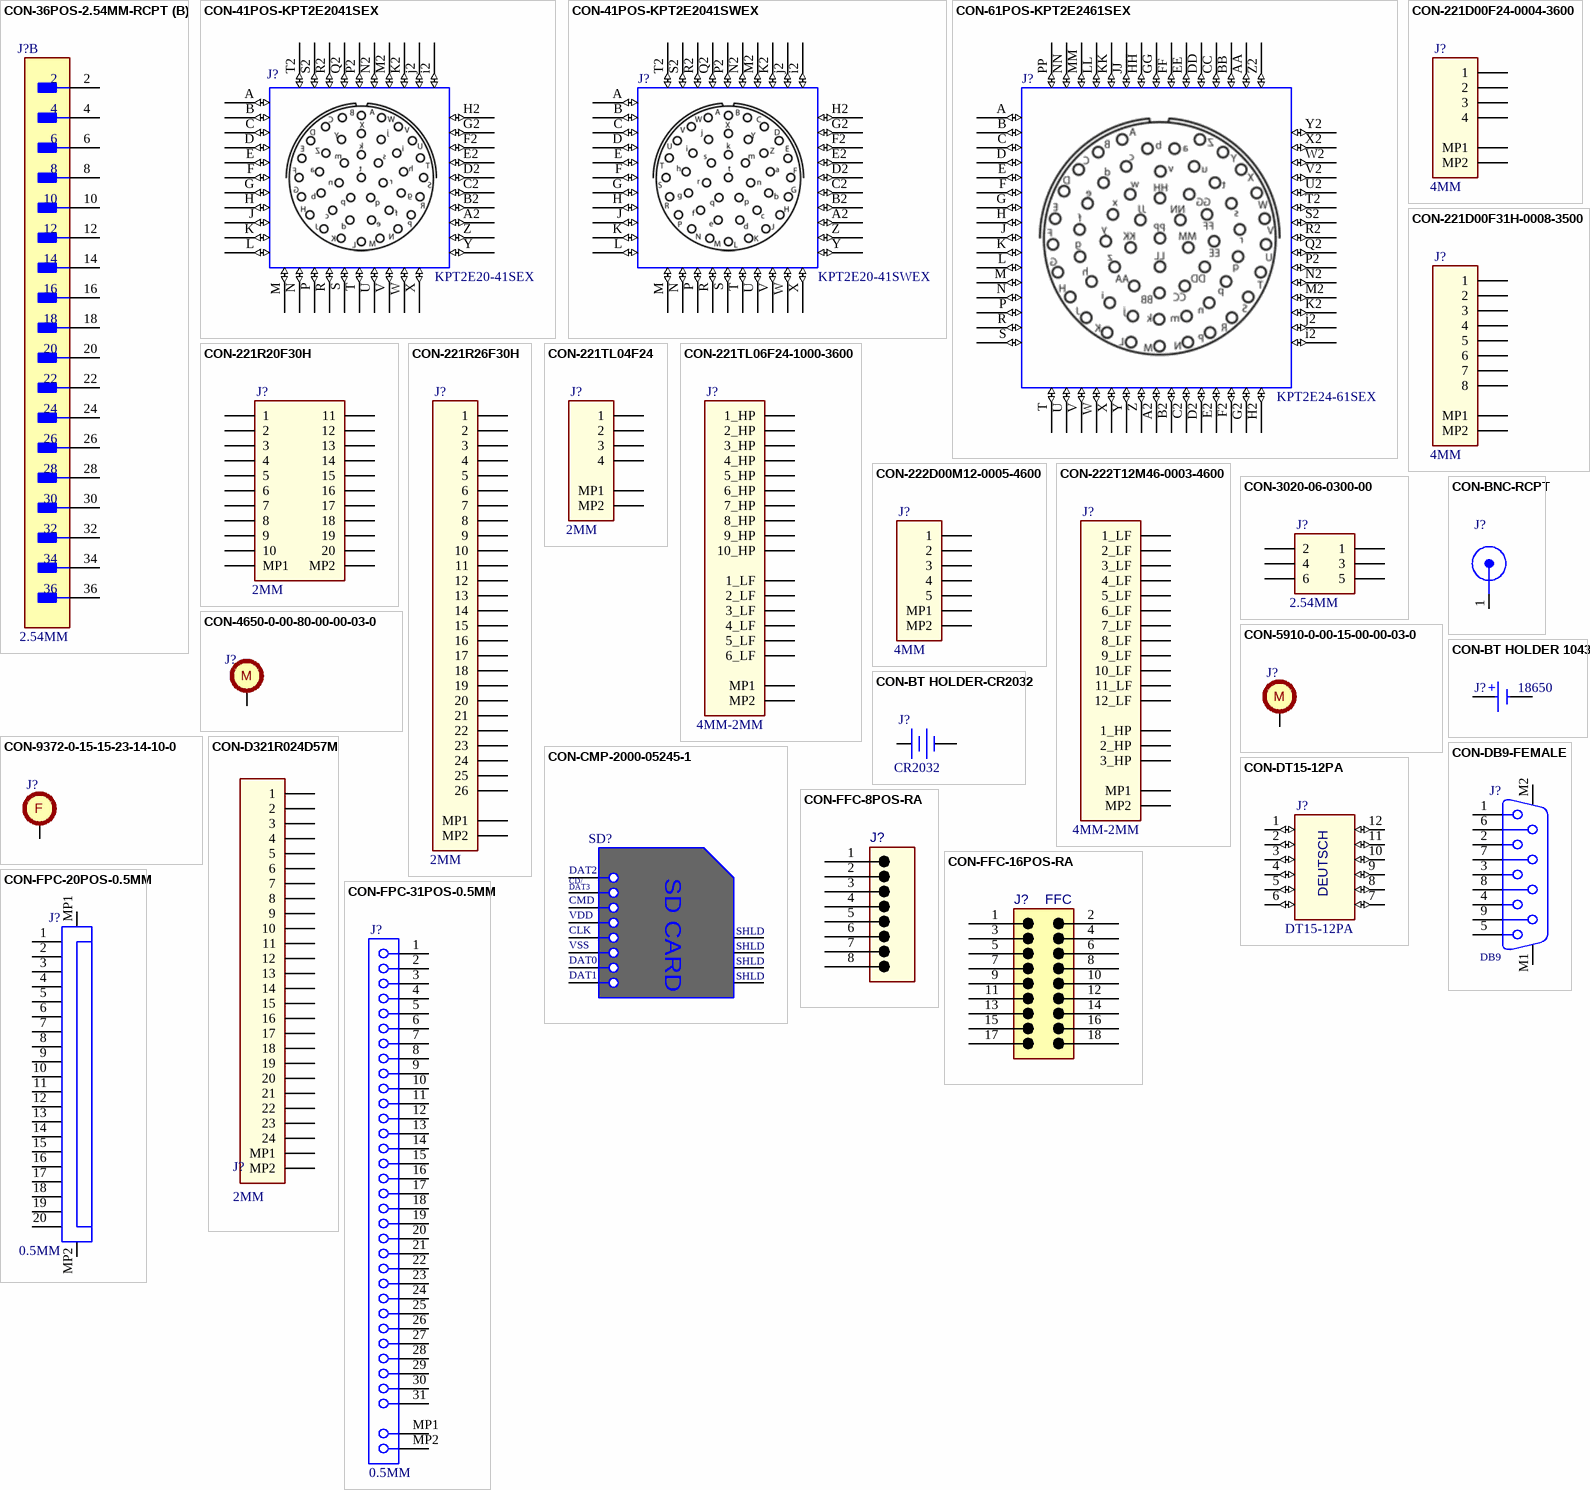
[diagram p7: symbols CON-36POS-2.54MM-RCPT to CON-FPC-31POS-0.5MM]

## CON-36POS-2.54MM-RCPT
designator J?, comment 2.54MM
CONN RCPT 36POS 0.1 TIN PCB; Manufacturer: Samtec; Manufacturer Part Number: SSW-118-01-T-D; Mating Cycles: 100; Gender: Receptacle; Number of Contacts: 36; Connector Type: Receptacle,Socket; Max Voltage Rating (AC): 550V; Max Current Rating: 5.5A; Contact Resistance: 10mR; Row Spacing: 0.1inch; Supplier 1: Digi-Key; Supplier Part Number 1: SAM1212-18-ND; Stock: 395; Pricing: 1=2.61, 10=2.509, 25=2.3, 50=2.1954, 100=2.0909, 250=1.8295, 500=1.7772 (USD); RoHS: Yes; Mount: Through Hole; Contact Plating: Tin; Contact Material: Bronze; Color: Black; Housing Color: Black; Housing Material: Polymer; Min Operating Temperature: -55°C; Max Operating Temperature: 105°C; Termination: Solder; Number of Rows: 2; Orientation: Straight; Number of Positions: 36; Packaging: Bulk; Length: 46.23mm; Width: 4.95mm; Pitch: 2.54mm; Depth: 4.95mm; Lead Free: Lead Free; REACH SVHC: No SVHC; ComponentLink1URL: https://datasheet.ciiva.com/750/ssw-1xx-xx-xxx-x-xx-xxx-xx-mkt-750011.pdf?src-supplier=Digi-Key; ComponentLink1Description: https://datasheet.ciiva.com/750/ssw-1xx-xx-xxx-x-xx-xxx-xx-mkt-750011.pdf?src-supplier=Digi-Key
footprint CON-36POS-2.54MM-RCPT
part A pins: 1, 3, 5, 7, 9, 11, 13, 15, 17, 19, 21, 23, 25, 27, 29, 31, 33, 35
part B pins: 2, 4, 6, 8, 10, 12, 14, 16, 18, 20, 22, 24, 26, 28, 30, 32, 34, 36

## CON-41POS-KPT2E2041SEX
designator J?, comment KPT2E20-41SEX
KPT 41C 41#20 SKT RECP; Manufacturer: ITT Cannon; Number of Contacts: 41; Gender: Female; Current Rating: 7.5A; Connector Type: Receptacle; Ratings: Environment Resistant; Washability: OK; .Creator: M.OZKAN; .PCBCHK: USED; Supplier 1: Digi-Key; Supplier Part Number 1: IKPT2E20-41SEX-ND; Manufacturer Part Number: KPT2E20-41SEX; Stock: 0; Pricing: 1=78.63, 10=63.837, 25=60.3336, 50=56.4412, 100=52.938 (USD); RoHS: No; Mount: Through Hole,Panel,Flanges; Contact Plating: Gold; Min Operating Temperature: -55°C; Max Operating Temperature: 125°C; Packaging: Bulk; Termination: Solder; Package Quantity: 1; Fastening Type: Bayonet; Number of Positions: 41; ComponentLink1URL: https://www.ittcannon.com/Core/medialibrary/ITTCannon/website/Literature/Catalogs-Brochures/ITT-Cannon-KPT-KPSE-KPTC-Catalog.pdf?src-supplier=Digi-Key; ComponentLink1Description: https://www.ittcannon.com/Core/medialibrary/ITTCannon/website/Literature/Catalogs-Brochures/ITT-Cannon-KPT-KPSE-KPTC-Catalog.pdf?src-supplier=Digi-Key; .SCHCHK: USED
footprint CON-41POS-KPT2E2041SEX
pins: A (io), A2 (io), B (io), B2 (io), C (io), C2 (io), D (io), D2 (io), E (io), E2 (io), F (io), F2 (io), G (io), G2 (io), H (io), H2 (io), i2 (io), J (io), j2 (io), K (io), K2 (io), L (io), M (io), M2 (io), N (io), N2 (io), P (io), P2 (io), Q2 (io), R (io), R2 (io), S (io), S2 (io), T (io), T2 (io), U (io), V (io), W (io), X (io), Y (io), Z (io)

## CON-41POS-KPT2E2041SWEX
designator J?, comment KPT2E20-41SWEX
KPT 41C 41#20 SKT RECP; Manufacturer: ITT Cannon; Manufacturer Part Number: KPT2E20-41SWEXA206; Connector Type: Receptacle; Number of Positions: 41; Current Rating: 7.5A; Ratings: Environment Resistant; Washability: OK; .Creator: M.OZKAN; .PCBCHK: USED; Supplier 1: Digi-Key; Supplier Part Number 1: KPT2E20-41SWEXA206-ND; Stock: 0; Pricing: 1=78.68, 10=63.876, 25=60.3708, 50=56.476, 100=52.9707 (USD); RoHS: Yes; Mount: Through Hole,Panel,Flanges; Number of Pins: 41; Contact Plating: Gold; Min Operating Temperature: -55°C; Max Operating Temperature: 125°C; Package Quantity: 1; Packaging: Bulk; Termination: Solder; Fastening Type: Bayonet; ComponentLink1URL: https://www.ittcannon.com/Core/medialibrary/ITTCannon/website/Literature/Catalogs-Brochures/ITT-Cannon-KPT-KPSE-KPTC-Catalog.pdf?src-supplier=Digi-Key; ComponentLink1Description: https://www.ittcannon.com/Core/medialibrary/ITTCannon/website/Literature/Catalogs-Brochures/ITT-Cannon-KPT-KPSE-KPTC-Catalog.pdf?src-supplier=Digi-Key; .SCHCHK: USED
footprint CON-41POS-KPT2E2041SWEX
pins: A (io), A2 (io), B (io), B2 (io), C (io), C2 (io), D (io), D2 (io), E (io), E2 (io), F (io), F2 (io), G (io), G2 (io), H (io), H2 (io), i2 (io), J (io), j2 (io), K (io), K2 (io), L (io), M (io), M2 (io), N (io), N2 (io), P (io), P2 (io), Q2 (io), R (io), R2 (io), S (io), S2 (io), T (io), T2 (io), U (io), V (io), W (io), X (io), Y (io), Z (io)

## CON-61POS-KPT2E2461SEX
designator J?, comment KPT2E24-61SEX
KPT 61C 61#20 SKT RECP; Manufacturer: ITT Cannon; Body Material: Aluminium; Body Plating: Cadmium; Connector Type: Receptacle,Circular; Number of Positions: 61; Gender: Receptacle; Current Rating: 7.5A; Ratings: Environment Resistant; Washability: OK; .Creator: M.OZKAN; .PCBCHK: USED; Supplier 1: Digi-Key; Supplier Part Number 1: IKPT2E24-61SEX-ND; Manufacturer Part Number: KPT2E24-61SEX; Stock: 305; Pricing: 1=103.65, 10=90.546, 25=85.7808, 50=81.0152, 100=79.2281 (USD); RoHS: Yes; Mount: Through Hole,Panel,Flanges; Contact Material: Copper Alloy; Contact Plating: Gold; Min Operating Temperature: -55°C; Max Operating Temperature: 125°C; Termination: Solder; Number of Contacts: 61; Package Quantity: 1; Fastening Type: Bayonet; Packaging: Bulk; REACH SVHC: No SVHC; ComponentLink1URL: https://datasheet.ciiva.com/7961/1811874-7961718.pdf?src-supplier=Element14; ComponentLink1Description: https://datasheet.ciiva.com/7961/1811874-7961718.pdf?src-supplier=Element14; .SCHCHK: USED
footprint CON-61POS-KPT2E2461SEX
pins: A (io), A2 (io), AA (io), B (io), B2 (io), BB (io), C (io), C2 (io), CC (io), D (io), D2 (io), DD (io), E (io), E2 (io), EE (io), F (io), F2 (io), FF (io), G (io), G2 (io), GG (io), H (io), H2 (io), HH (io), i2 (io), J (io), j2 (io), JJ (io), K (io), K2 (io), KK (io), L (io), LL (io), M (io), M2 (io), MM (io), N (io), N2 (io), NN (io), P (io), P2 (io), PP (io), Q2 (io), R (io), R2 (io), S (io), S2 (io), T (io), T2 (io), U (io), U2 (io), V (io), V2 (io), W (io), W2 (io), X (io), X2 (io), Y (io), Y2 (io), Z (io), Z2 (io)

## CON-221D00F24-0004-3600
designator J?, comment 4MM
CMM Series 220 MALE; Manufacturer Part Number: 221D00F24-0004-3600; Manufacturer: NICOMATIC
footprint CON-221D00F24-0004-3600
pins: 1, 2, 3, 4, MP1, MP2

## CON-221D00F31H-0008-3500
designator J?, comment 4MM
CMM 220 FEMALE 90° SMT; Manufacturer: NICOMATIC; Manufacturer Part Number: 221D00F31H-0008-3500; Mating: 222E00M16-0008-4320
footprint CON-221D00F31H-0008-3500
pins: 1, 2, 3, 4, 5, 6, 7, 8, MP1, MP2

## CON-221R20F30H
designator J?, comment 2MM
CMM 220 MALE 90° SMT; Manufacturer Part Number: 221R20F30H; Manufacturer: NICOMATIC; Mating: 222S20M16
footprint CON-221R20F30H
pins: 1, 2, 3, 4, 5, 6, 7, 8, 9, 10, 11, 12, 13, 14, 15, 16, 17, 18, 19, 20, MP1, MP2

## CON-221R26F30H
designator J?, comment 2MM
CMM 220 MALE 90° SMT; Manufacturer Part Number: 221R26F30H; Manufacturer: NICOMATIC; Mating: 222S26M16
footprint CON-221R26F30H
pins: 1, 2, 3, 4, 5, 6, 7, 8, 9, 10, 11, 12, 13, 14, 15, 16, 17, 18, 19, 20, 21, 22, 23, 24, 25, 26, MP1, MP2

## CON-221TL04F24
designator J?, comment 2MM
CMM 220 MALE STRAIGHT SMT; Manufacturer Part Number: 221TL04F24; Manufacturer: NICOMATIC; Mating: 222S04M16
footprint CON-221TL04F24
pins: 1, 2, 3, 4, MP1, MP2

## CON-221TL06F24-1000-3600
designator J?, comment 4MM-2MM
CMM 220 MALE STRAIGHT SMT; Manufacturer Part Number: 221TL06F24-1000-3600; Manufacturer: NICOMATIC; Mating: 222C06M16-1000-4320
footprint CON-221TL06F24-1000-3600
pins: 1_HP, 1_LF, 2_HP, 2_LF, 3_HP, 3_LF, 4_HP, 4_LF, 5_HP, 5_LF, 6_HP, 6_LF, 7_HP, 8_HP, 9_HP, 10_HP, MP1, MP2

## CON-222D00M12-0005-4600
designator J?, comment 4MM
CMM 220 FEMALE 90° SMT; Manufacturer Part Number: 222D00M12-0005-4600; Manufacturer: NICOMATIC; Mating: 221E00F21-0005-3320
footprint CON-222D00M12-0005-4600
pins: 1, 2, 3, 4, 5, MP1, MP2

## CON-222T12M46-0003-4600
designator J?, comment 4MM-2MM
CMM Series 220 MALE; Manufacturer Part Number: 222T12M46-0003-4600; Manufacturer: NICOMATIC; Mating: 221S12F60-0003-3320
footprint CON-222T12M46-0003-4600
pins: 1_HP, 1_LF, 2_HP, 2_LF, 3_HP, 3_LF, 4_LF, 5_LF, 6_LF, 7_LF, 8_LF, 9_LF, 10_LF, 11_LF, 12_LF, MP1, MP2

## CON-3020-06-0300-00
designator J?, comment 2.54MM
CONN HEADER SMD 6POS 2.54MM; Manufacturer: CNC Tech; Manufacturer Part Number: 3020-06-0300-00; Number of Positions: 6; Connector Type: Male Pin; Pitch: 0.1inch; Supplier 1: Digi-Key; RoHS: Yes; Category: Connectors; Stock 1: 1374; Pricing 1: 1=0,48000, 10=0,45000, 100=0,34500, 500=0,30000, 1000=0,24750, 5000=0,21750, 10000=0,20250 (USD); Mount: Surface Mount; Contact Plating: Gold; Package Quantity: 180; Number of Rows: 2; Packaging: Tray; Termination: Solder; Row Spacing: 0.1inch; ComponentLink1URL: http://cnctech.us/pdfs/3020-XX-0300-00.pdf?src-supplier=Digi-Key; ComponentLink1Description: http://cnctech.us/pdfs/3020-XX-0300-00.pdf?src-supplier=Digi-Key; ComponentLink2URL: http://cnctech.us/idcmatching2.pdf?src-supplier=Digi-Key; ComponentLink2Description: http://cnctech.us/idcmatching2.pdf?src-supplier=Digi-Key; Supplier Part Number 1: 1175-1864-ND
footprint CON-3020-06-0300-00
pins: 1, 2, 3, 4, 5, 6

## CON-4650-0-00-80-00-00-03-0
designator J?, comment M
CONN PC PIN CIRC; Manufacturer: Mill-Max; Manufacturer Part Number: 4650-0-00-80-00-00-03-0; Insulation: Non-Insulated; Supplier 1: Digi-Key; Supplier Part Number 1: ED10167-ND; Stock: 896; Pricing: 1=0.77, 10=0.677, 25=0.6368, 50=0.6102, 100=0.5837, 250=0.5306, 500=0.4775, 1000=0.4245, 2500=0.3847 (USD); RoHS: No; Mount: Through Hole; Contact Material: Brass; Contact Plating: Tin; Packaging: Bulk; Termination: PC Pin; ComponentLink1URL: https://www.mill-max.com/assets/pdfs/223.3.pdf?src-supplier=Digi-Key; ComponentLink1Description: https://www.mill-max.com/assets/pdfs/223.3.pdf?src-supplier=Digi-Key
footprint CON-4650
pins: 1

## CON-5910-0-00-15-00-00-03-0
designator J?, comment M
SOLDER MOUNT NAIL HEAD PIN; Manufacturer: Mill-Max; Manufacturer Part Number: 5910-0-00-15-00-00-03-0; Supplier 1: Digi-Key; Supplier Part Number 1: 54-5910-0-00-15-00-00-03-0-ND; Stock: 348; Pricing: 1=0.84, 10=0.738, 25=0.6948, 50=0.6658, 100=0.6369, 250=0.579, 500=0.5211, 1000=0.4632, 2500=0.4198 (USD); RoHS: No; ComponentLink1Description: datasheet; ComponentLink1URL: https://www.mill-max.com/products/datasheet/pinsrecs/5910-0-00-15-00-00-03-0
footprint CON-5910
pins: 1

## CON-9372-0-15-15-23-14-10-0
designator J?, comment F
CONN PIN RCPT; Manufacturer: Mill-Max; Manufacturer Part Number: 9372-0-15-15-23-14-10-0; Supplier 1: Digi-Key; Supplier Part Number 1: 9372-0-15-15-23-14-10-0-ND; Stock: 1000; Pricing: 1=1.53, 10=1.388, 25=1.3032, 50=1.2466, 100=1.1899, 250=1.0766, 500=0.9916, 1000=0.8499 (USD); RoHS: Yes; Mount: Through Hole; Packaging: Bulk; Package Quantity: 500; ComponentLink1URL: https://datasheet.ciiva.com/12491/159n-58938-12491735.pdf?src-supplier=Mouser; ComponentLink1Description: https://datasheet.ciiva.com/12491/159n-58938-12491735.pdf?src-supplier=Mouser
footprint CON-9372
pins: 1